# Altium footprint library PcbLib1.PcbLib: 105 footprints (part 1 of 7)
Each footprint in its own frame and in the unit in brackets; x right, y up, seen from the top. Pads: shape width x height; smd on the part's side, far side on the other; paste and mask are expansions set on the pad; w line width, h text height; cw(c..) or ccw(c..) is an arc to the next point about the centre after c.
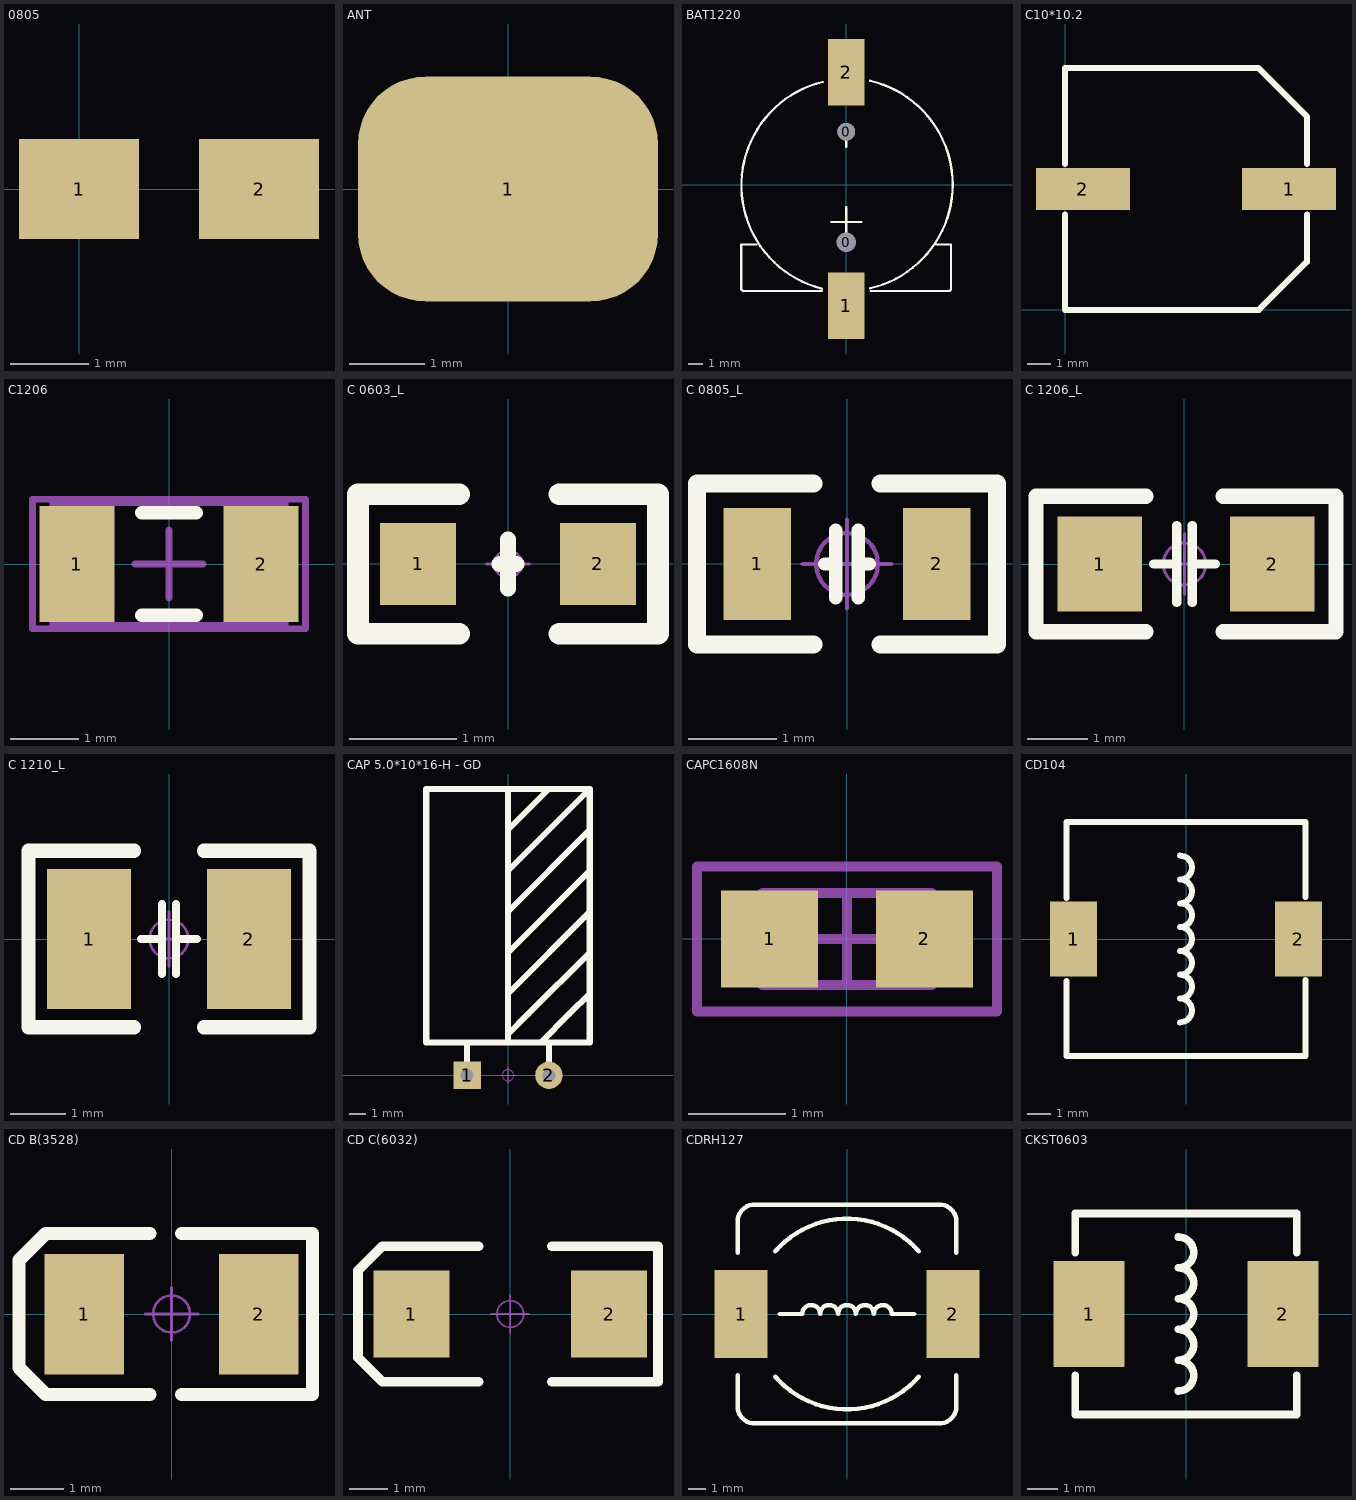
[diagram p0: the footprints below, top view; thin cyan lines are the x and y axes]

## 0805 [mil]
pads (2):
  rect 60x50 smd: 1(0,0) 2(90,0)

## ANT [mm]
pads (1):
  rrect60% 4x3 smd: 1(0,0)

## BAT1220 [mm]
pads (4):
  round 1.2 hole 1.3 unplated: 0(0,-3.886)
  round 1.2 hole 1.2 unplated: 0(0,3.607)
  rect 2.5x4.5 smd: 1(0,-8.2) 2(0,7.645)
Top Overlay:
  lines w0.152: -6.096,-4.039 -7.112,-4.039 -7.112,-7.087 -7.004,-7.195 -1.651,-7.195 ; -1.636,-7.038 cw(c0.107,-0.031) -1.584,6.988 ; -1.016,-2.515 1.016,-2.515 ; 0,-3.531 0,-1.499 ; 0,2.565 0,4.089 ; 1.624,-7.01 ccw(c0,0.025) 1.624,7.06 ; 1.651,-7.195 7.004,-7.195 7.112,-7.087 7.112,-4.039 6.096,-4.039
3D body "User Library-Battery Holder for CR1220 SMD.sldprt": height 4.23, standoff -0.52, extent -7.381,-9.767 7.368,9.033

## C10*10.2 [mm]
pads (2):
  rect 4x1.8 smd: 1(9.538,5.15) 2(0.762,5.15)
Top Overlay:
  lines w0.254: 0,4.064 0,0 8.255,0 10.3,2.045 10.3,4.064 ; 0,6.223 0,10.3 8.242,10.3 10.3,8.242 10.3,6.223

## C1206 [mm]
pads (2):
  rect 1.1x1.7 smd: 1(-1.35,0) 2(1.35,0)
Top Overlay:
  lines w0.2: -0.4,-0.75 0.4,-0.75 ; -0.4,0.75 0.4,0.75
Mechanical 13:
  lines w0.1: -1.7,-0.9 -1.7,0.9 1.7,0.9 1.7,-0.9 -1.7,-0.9
Mechanical 15:
  lines w0.1: -0.5,0 0.5,0 ; 0,-0.5 0,0.5 ; -2,-0.95 -2,0.95 2,0.95 2,-0.95 -2,-0.95
3D body: height 1.3, standoff 0, extent -1.7,-0.9 1.7,0.9

## C 0603_L [mil] "无极性贴片电容                                       淘宝ID:黄晶宝石"
pads (2):
  rect 28x30 smd: 1(-33,0) 2(33,0)
Top Overlay:
  lines w6: -3,0 0,0 3,0 ; 0,-9 0,9
  lines w8: -55,-25.59 -55,25.59 ; -54.18,-25.59 -18,-25.59 ; -54.18,25.59 -18,25.59 ; 18.82,-25.59 55,-25.59 55,25.59 18.82,25.59
Mechanical 15:
  circle w1: c0,0 r5
  lines w1: -7.87,0 7.87,0 ; 0,-7.87 0,7.87
3D body "C 0603.STEP": height 31.89, standoff -0.39, extent -31.5,-16.14 31.5,16.14

## C 0805_L [mil] "无极性贴片电容                                        淘宝ID:黄晶宝石"
height 19.68
pads (2):
  rect 30x50 smd: 1(-40,0) 2(40,0)
Top Overlay:
  lines w6: -10,0 -5,0 ; -5,-15 -5,15 ; 5,-15 5,15 ; 5,0 10,0
  lines w8: -15,-36 -66.93,-36 -66.93,36 -15,36 ; 15,-36 66.93,-36 66.93,36 15,36
Mechanical 15:
  circle w1.97: c0,0 r13.78
  circle w1.97: c0,0 r13.78
  lines w1.97: -19.68,0 19.68,0 -19.68,0 ; 0,-19.68 0,19.68 0,-19.68
3D body "C 0805.STEP": height 20.08, standoff -0.39, extent -39.37,-24.02 39.37,24.02

## C 1206_L [mil] "无极性贴片电容"
pads (2):
  rect 55x62 smd: 1(-55.12,0) 2(57.09,0)
Top Overlay:
  lines w6: -20,0 -5,0 ; -5,-25 -5,25 ; 5,-25 5,25 ; 5,0 20,0
  lines w10: -25,-44 -96.46,-44 -96.46,44 -25,44 ; 25,-44 96.46,-44 ; 25,44 96.46,44 ; 98.43,-44 98.43,44
Mechanical 15:
  circle w1.97: c0,0 r13.78
  lines w1.97: -19.68,0 19.68,0 ; 0,-19.68 0,19.68
3D body "C 1206.STEP": height 47.64, standoff -0.39, extent -62.99,-31.89 62.99,31.89

## C 1210_L [mm] "无极性贴片电容                                淘宝ID:黄晶宝石"
pads (2):
  rect 1.524x2.54 smd: 1(-1.45,0) 2(1.45,0)
Top Overlay:
  lines w0.152: -0.508,0 -0.127,0 ; -0.127,-0.635 -0.127,0.635 ; 0.127,-0.635 0.127,0.635 ; 0.127,0 0.508,0
  lines w0.254: -0.635,-1.6 -2.55,-1.6 -2.55,1.6 -0.635,1.6 ; 0.635,-1.6 2.55,-1.6 2.55,1.6 0.635,1.6
Mechanical 15:
  circle w0.05: c0,0 r0.35
  lines w0.05: -0.5,0 0.5,0 ; 0,-0.5 0,0.5
3D body "C 1210.STEP": height 1.54, standoff 0.01, extent -1.6,-1.285 1.6,1.285

## CAP 5.0*10*16-H - GD [mm] "脚距5mm直径10mm高度16mm"
pads (2):
  rect 1.7x1.7 hole 0.8: 1(-2.54,0)
  round 1.7 hole 0.8: 2(2.54,0)
Top Overlay:
  lines w0.381: -2.54,0.762 -2.54,1.778 -2.54,2.032 ; 0,2.032 0,2.54 ; 0,3.81 0,17.78 ; 0,4.064 0,2.54 ; 0,5.08 5.08,10.16 ; 0,7.62 5.08,12.7 ; 0,10.16 5.08,15.24 ; 0,12.7 5.08,17.78 ; 0,15.24 2.54,17.78 ; 2.032,2.032 3.81,3.81 5.08,5.08 ; 2.54,0.762 2.54,1.778 2.54,2.032 ; 5.08,7.62 1.27,3.81 0,2.54 ; 5.08,17.78 -5.08,17.78 -5.08,2.032 5.08,2.032 5.08,17.78
Mechanical 15:
  circle w0.05: c0,0 r0.35
  lines w0.05: -0.5,0 0.5,0 ; 0,-0.5 0,0.5
3D body "CAP 5X10X16-H.STEP": height 10.03, standoff -3.48, extent -5.04,-0.3 4.97,17.91

## CAPC1608N [mm]
pads (2):
  rect 1x1 smd: 1(-0.8,0) 2(0.8,0)
Mechanical 13:
  lines w0.1: -0.875,-0.475 0.875,-0.475 0.875,0.475 -0.875,0.475 -0.875,-0.475
Mechanical 15:
  lines w0.1: -0.475,0 0.475,0 ; 0,-0.475 0,0.475 ; -1.55,-0.75 1.55,-0.75 1.55,0.75 -1.55,0.75 -1.55,-0.75
3D body: height 0.85, standoff 0, extent -0.875,-0.475 0.875,0.475

## CD104 [mm] "10*9*4mm（长宽高）        淘宝ID:黄晶宝石"
pads (2):
  rect 2x3.2 smd: 1(-4.8,0) 2(4.8,0)
Top Overlay:
  lines w0.254: -5.1,-1.798 -5.1,-5 2.54,-5 5.1,-5 5.1,-1.755 ; -5.1,1.755 -5.1,5 2.54,5 5.1,5 5.1,1.798 ; -0.254,-3.556 ccw(c-0.254,-3.048) -0.254,-2.54 ccw(c-0.254,-2.032) -0.254,-1.524 ccw(c-0.254,-1.016) -0.254,-0.508 ccw(c-0.254,0) -0.254,0.508 ccw(c-0.254,1.016) -0.254,1.524 ccw(c-0.254,2.032) -0.254,2.54 ccw(c-0.254,3.048) -0.254,3.556
3D body "CD104.STEP": height 4.7, standoff 0, extent -4.954,-4.5 4.954,4.5

## CD B(3528) [mm] "长3.5mm，宽2.8mm，厚1.9mm      淘宝ID:黄晶宝石"
pads (2):
  rect 1.5x2.28 smd: 1(-1.65,0) 2(1.65,0)
Top Overlay:
  lines w0.254: -0.411,-1.524 -2.379,-1.524 -2.887,-1.016 -2.887,1.016 -2.379,1.524 -0.411,1.524 ; 0.19,-1.524 2.667,-1.524 2.667,1.524 0.19,1.524
Mechanical 15:
  circle w0.05: c0,0 r0.35
  lines w0.05: -0.5,0 0.5,0 ; 0,-0.5 0,0.5
3D body "CD B(3528).STEP": height 1.9, standoff -0.01, extent -1.751,-1.4 1.75,1.4

## CD C(6032) [mm] "长6.0mm，宽3.2mm，厚2.5mm      淘宝ID:黄晶宝石"
pads (2):
  rect 2x2.3 smd: 1(-2.6,0) 2(2.6,0)
Top Overlay:
  lines w0.254: -0.826,-1.778 -3.366,-1.778 -4.001,-1.143 -4.001,1.143 -3.366,1.778 -0.826,1.778 ; 1.091,-1.778 3.885,-1.778 3.885,1.778 1.091,1.778
Mechanical 15:
  circle w0.05: c0,0 r0.35
  lines w0.05: -0.5,0 0.5,0 ; 0,-0.5 0,0.5
3D body "CD C(6032).STEP": height 2.5, standoff -0.01, extent -3,-1.6 3,1.6

## CDRH127 [mm] "12*12*8mm（长宽高）"
pads (2):
  rect 3x5 smd: 1(-6,0) 2(6,0)
Top Overlay:
  lines w0.254: -6.2,-3.475 -6.2,-5.23 ccw(c-5.23,-5.23) -5.23,-6.2 5.23,-6.2 ccw(c5.23,-5.23) 6.2,-5.23 6.2,-3.475 ; -6.2,3.475 -6.2,5.23 cw(c-5.23,5.23) -5.23,6.2 5.23,6.2 cw(c5.23,5.23) 6.2,5.23 6.2,3.475 ; -4.064,-3.556 ccw(c0,0) 4.064,-3.556 ; -4.064,3.556 cw(c0,0) 4.064,3.556 ; -3.81,0 -2.54,0 cw(c-2.032,0) -1.524,0 cw(c-1.016,0) -0.508,0 cw(c0,0) 0.508,0 cw(c1.016,0) 1.524,0 cw(c2.032,0) 2.54,0 3.81,0
3D body "CDRH127.STEP": height 7.8, standoff 0, extent -6,-6 6,6

## CKST0603 [mm] "7.4*6.4*3mm（长宽高）"
pads (2):
  rect 2.35x3.5 smd: 1(-3.2,0) 2(3.2,0)
Top Overlay:
  lines w0.254: -3.65,-2.032 -3.65,-3.314 3.65,-3.314 3.65,-2.032 ; -3.65,2.032 -3.65,3.314 3.65,3.314 3.65,2.032 ; -0.254,-2.54 ccw(c-0.254,-2.032) -0.254,-1.524 ccw(c-0.254,-1.016) -0.254,-0.508 ccw(c-0.254,0) -0.254,0.508 ccw(c-0.254,1.016) -0.254,1.524 ccw(c-0.254,2.032) -0.254,2.54
3D body "CD73.STEP": height 3.75, standoff 0, extent -3.849,-3.5 3.849,3.5